# Altium integrated library Weidmueller_OMNIMATE_Signal.IntLib: 2550 symbols (part 42 of 45)
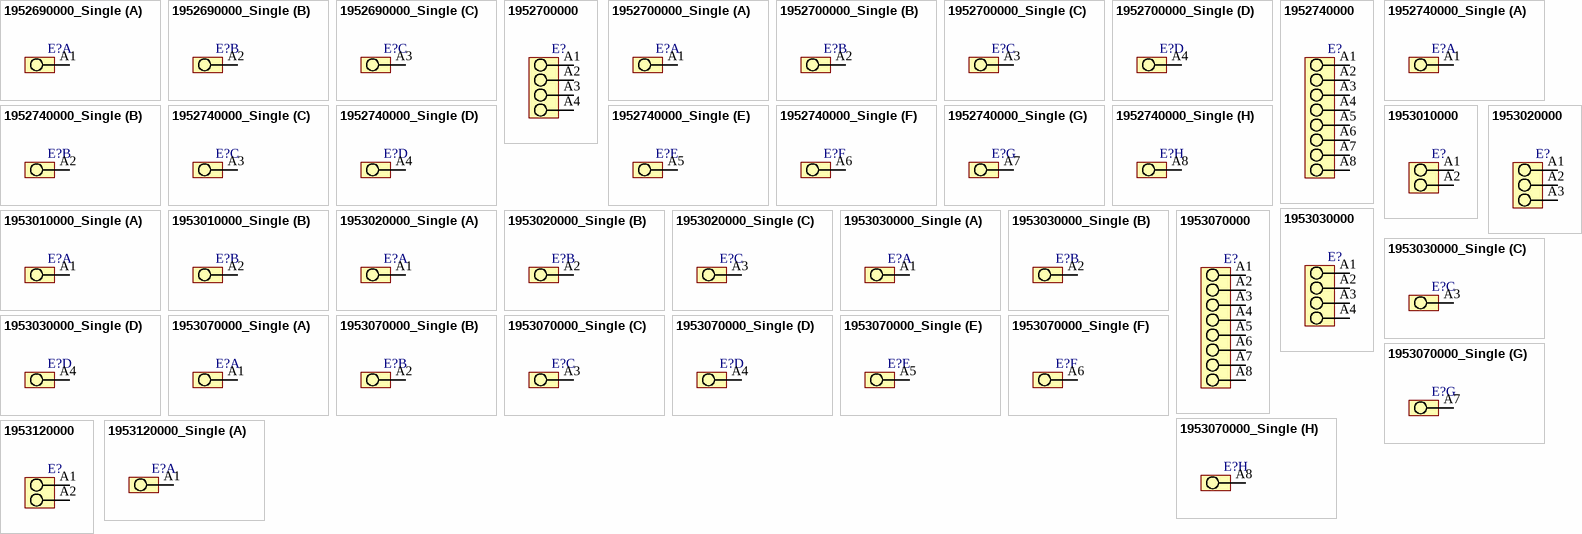
[diagram p252: symbols 1952690000_Single to 1953120000_Single]

## 1952740000_Single
designator E?
OMNIMATE Signal - series LMZF; PartNumber: 1952740000; Manufacturer: Weidmueller; Short_text_for_material: LMZFL 7/8/135 3.5SW; Side_termination_characteristic: closed side; Mounting_onto_the_PCB: Solder connection; Pitch_mm: 7,5 mm; Pitch_inch: 0,295 inch; No_of_poles: 8; Solder_pin_length_mm: 3,5 mm; Contact_material: E-Cu; Contact_surface: tinned; Insulating_material: Wemid (PA); UL_94_flammability_rating: V-0; Rated_voltage_for_surge_voltage_class_pollution_degree_II_2: 1000 V; Rated_current_min_no_of_poles_TU_20_deg_C: 24 A; Solid_min_H05_07_V_U: 0,13 mm²; Solid_max_H05_07_V_U: 2,5 mm²; Rated_voltage_use_group_B_UL_1059: 300 V; Rated_current_use_group_B_UL_1059: 15 A; Wire_cross_section_AWG_min_UL_1059: AWG 26; Wire_cross_section_AWG_max_UL_1059: AWG 14; PackageReference: LMZFL_7_135_08; Colour: Black; Packaging: Box; Qty: 100 PCS; Revision: V1; ComponentLink1Description: Manufacturer URL; ComponentLink1URL: http://www.weidmueller.com/; ComponentLink2Description: URL Link1; ComponentLink2URL: http://catalog.weidmueller.com/catalog/Start.do?localeId=en&ObjectID=1952740000
footprint LMZFL_7_135_08 (OMNIMATE Signal - Serie LMZF  LMZFL 7/8/135 3.5)
part A pins: A1
part B pins: A2
part C pins: A3
part D pins: A4
part E pins: A5
part F pins: A6
part G pins: A7
part H pins: A8
1 alternate drawing of the same symbol

## 1953010000
designator E?
OMNIMATE Signal - series LMZF; PartNumber: 1953010000; Manufacturer: Weidmueller; Short_text_for_material: LMZFL 7/2/135 3.5OR; Side_termination_characteristic: closed side; Mounting_onto_the_PCB: Solder connection; Pitch_mm: 7,5 mm; Pitch_inch: 0,295 inch; No_of_poles: 2; Solder_pin_length_mm: 3,5 mm; Contact_material: E-Cu; Contact_surface: tinned; Insulating_material: Wemid (PA); UL_94_flammability_rating: V-0; Rated_voltage_for_surge_voltage_class_pollution_degree_II_2: 1000 V; Solid_min_H05_07_V_U: 0,13 mm²; Solid_max_H05_07_V_U: 2,5 mm²; Rated_voltage_use_group_B_UL_1059: 300 V; Rated_current_use_group_B_UL_1059: 15 A; Wire_cross_section_AWG_min_UL_1059: AWG 26; Wire_cross_section_AWG_max_UL_1059: AWG 14; PackageReference: LMZFL_7_135_02; Colour: Orange; Packaging: Box; Qty: 100 PCS; Revision: V1; ComponentLink1Description: Manufacturer URL; ComponentLink1URL: http://www.weidmueller.com/; ComponentLink2Description: URL Link1; ComponentLink2URL: http://catalog.weidmueller.com/catalog/Start.do?localeId=en&ObjectID=1953010000
footprint LMZFL_7_135_02 (OMNIMATE Signal - Serie LMZF  LMZFL 7/2/135 3.5)
pins: A1, A2
1 alternate drawing of the same symbol

## 1953010000_Single
designator E?
OMNIMATE Signal - series LMZF; PartNumber: 1953010000; Manufacturer: Weidmueller; Short_text_for_material: LMZFL 7/2/135 3.5OR; Side_termination_characteristic: closed side; Mounting_onto_the_PCB: Solder connection; Pitch_mm: 7,5 mm; Pitch_inch: 0,295 inch; No_of_poles: 2; Solder_pin_length_mm: 3,5 mm; Contact_material: E-Cu; Contact_surface: tinned; Insulating_material: Wemid (PA); UL_94_flammability_rating: V-0; Rated_voltage_for_surge_voltage_class_pollution_degree_II_2: 1000 V; Solid_min_H05_07_V_U: 0,13 mm²; Solid_max_H05_07_V_U: 2,5 mm²; Rated_voltage_use_group_B_UL_1059: 300 V; Rated_current_use_group_B_UL_1059: 15 A; Wire_cross_section_AWG_min_UL_1059: AWG 26; Wire_cross_section_AWG_max_UL_1059: AWG 14; PackageReference: LMZFL_7_135_02; Colour: Orange; Packaging: Box; Qty: 100 PCS; Revision: V1; ComponentLink1Description: Manufacturer URL; ComponentLink1URL: http://www.weidmueller.com/; ComponentLink2Description: URL Link1; ComponentLink2URL: http://catalog.weidmueller.com/catalog/Start.do?localeId=en&ObjectID=1953010000
footprint LMZFL_7_135_02 (OMNIMATE Signal - Serie LMZF  LMZFL 7/2/135 3.5)
part A pins: A1
part B pins: A2
1 alternate drawing of the same symbol

## 1953020000
designator E?
OMNIMATE Signal - series LMZF; PartNumber: 1953020000; Manufacturer: Weidmueller; Short_text_for_material: LMZFL 7/3/135 3.5OR; Side_termination_characteristic: closed side; Mounting_onto_the_PCB: Solder connection; Pitch_mm: 7,5 mm; Pitch_inch: 0,295 inch; No_of_poles: 3; Solder_pin_length_mm: 3,5 mm; Contact_material: E-Cu; Contact_surface: tinned; Insulating_material: Wemid (PA); UL_94_flammability_rating: V-0; Rated_voltage_for_surge_voltage_class_pollution_degree_II_2: 1000 V; Solid_min_H05_07_V_U: 0,13 mm²; Solid_max_H05_07_V_U: 2,5 mm²; Rated_voltage_use_group_B_UL_1059: 300 V; Rated_current_use_group_B_UL_1059: 15 A; Wire_cross_section_AWG_min_UL_1059: AWG 26; Wire_cross_section_AWG_max_UL_1059: AWG 14; PackageReference: LMZFL_7_135_03; Colour: Orange; Packaging: Box; Qty: 100 PCS; Revision: V1; ComponentLink1Description: Manufacturer URL; ComponentLink1URL: http://www.weidmueller.com/; ComponentLink2Description: URL Link1; ComponentLink2URL: http://catalog.weidmueller.com/catalog/Start.do?localeId=en&ObjectID=1953020000
footprint LMZFL_7_135_03 (OMNIMATE Signal - Serie LMZF  LMZFL 7/3/135 3.5OR)
pins: A1, A2, A3
1 alternate drawing of the same symbol

## 1953020000_Single
designator E?
OMNIMATE Signal - series LMZF; PartNumber: 1953020000; Manufacturer: Weidmueller; Short_text_for_material: LMZFL 7/3/135 3.5OR; Side_termination_characteristic: closed side; Mounting_onto_the_PCB: Solder connection; Pitch_mm: 7,5 mm; Pitch_inch: 0,295 inch; No_of_poles: 3; Solder_pin_length_mm: 3,5 mm; Contact_material: E-Cu; Contact_surface: tinned; Insulating_material: Wemid (PA); UL_94_flammability_rating: V-0; Rated_voltage_for_surge_voltage_class_pollution_degree_II_2: 1000 V; Solid_min_H05_07_V_U: 0,13 mm²; Solid_max_H05_07_V_U: 2,5 mm²; Rated_voltage_use_group_B_UL_1059: 300 V; Rated_current_use_group_B_UL_1059: 15 A; Wire_cross_section_AWG_min_UL_1059: AWG 26; Wire_cross_section_AWG_max_UL_1059: AWG 14; PackageReference: LMZFL_7_135_03; Colour: Orange; Packaging: Box; Qty: 100 PCS; Revision: V1; ComponentLink1Description: Manufacturer URL; ComponentLink1URL: http://www.weidmueller.com/; ComponentLink2Description: URL Link1; ComponentLink2URL: http://catalog.weidmueller.com/catalog/Start.do?localeId=en&ObjectID=1953020000
footprint LMZFL_7_135_03 (OMNIMATE Signal - Serie LMZF  LMZFL 7/3/135 3.5OR)
part A pins: A1
part B pins: A2
part C pins: A3
1 alternate drawing of the same symbol

## 1953030000
designator E?
OMNIMATE Signal - series LMZF; PartNumber: 1953030000; Manufacturer: Weidmueller; Short_text_for_material: LMZFL 7/4/135 3.5OR; Side_termination_characteristic: closed side; Mounting_onto_the_PCB: Solder connection; Pitch_mm: 7,5 mm; Pitch_inch: 0,295 inch; No_of_poles: 4; Solder_pin_length_mm: 3,5 mm; Contact_material: E-Cu; Contact_surface: tinned; Insulating_material: Wemid (PA); UL_94_flammability_rating: V-0; Rated_voltage_for_surge_voltage_class_pollution_degree_II_2: 1000 V; Solid_min_H05_07_V_U: 0,13 mm²; Solid_max_H05_07_V_U: 2,5 mm²; Rated_voltage_use_group_B_UL_1059: 300 V; Rated_current_use_group_B_UL_1059: 15 A; Wire_cross_section_AWG_min_UL_1059: AWG 26; Wire_cross_section_AWG_max_UL_1059: AWG 14; PackageReference: LMZFL_7_135_04; Colour: Orange; Packaging: Box; Qty: 100 PCS; Revision: V1; ComponentLink1Description: Manufacturer URL; ComponentLink1URL: http://www.weidmueller.com/; ComponentLink2Description: URL Link1; ComponentLink2URL: http://catalog.weidmueller.com/catalog/Start.do?localeId=en&ObjectID=1953030000
footprint LMZFL_7_135_04 (OMNIMATE Signal - Serie LMZF  LMZFL 7/4/135 3.5OR)
pins: A1, A2, A3, A4
1 alternate drawing of the same symbol

## 1953030000_Single
designator E?
OMNIMATE Signal - series LMZF; PartNumber: 1953030000; Manufacturer: Weidmueller; Short_text_for_material: LMZFL 7/4/135 3.5OR; Side_termination_characteristic: closed side; Mounting_onto_the_PCB: Solder connection; Pitch_mm: 7,5 mm; Pitch_inch: 0,295 inch; No_of_poles: 4; Solder_pin_length_mm: 3,5 mm; Contact_material: E-Cu; Contact_surface: tinned; Insulating_material: Wemid (PA); UL_94_flammability_rating: V-0; Rated_voltage_for_surge_voltage_class_pollution_degree_II_2: 1000 V; Solid_min_H05_07_V_U: 0,13 mm²; Solid_max_H05_07_V_U: 2,5 mm²; Rated_voltage_use_group_B_UL_1059: 300 V; Rated_current_use_group_B_UL_1059: 15 A; Wire_cross_section_AWG_min_UL_1059: AWG 26; Wire_cross_section_AWG_max_UL_1059: AWG 14; PackageReference: LMZFL_7_135_04; Colour: Orange; Packaging: Box; Qty: 100 PCS; Revision: V1; ComponentLink1Description: Manufacturer URL; ComponentLink1URL: http://www.weidmueller.com/; ComponentLink2Description: URL Link1; ComponentLink2URL: http://catalog.weidmueller.com/catalog/Start.do?localeId=en&ObjectID=1953030000
footprint LMZFL_7_135_04 (OMNIMATE Signal - Serie LMZF  LMZFL 7/4/135 3.5OR)
part A pins: A1
part B pins: A2
part C pins: A3
part D pins: A4
1 alternate drawing of the same symbol

## 1953070000
designator E?
OMNIMATE Signal - series LMZF; PartNumber: 1953070000; Manufacturer: Weidmueller; Short_text_for_material: LMZFL 7/8/135 3.5OR; Side_termination_characteristic: closed side; Mounting_onto_the_PCB: Solder connection; Pitch_mm: 7,5 mm; Pitch_inch: 0,295 inch; No_of_poles: 8; Solder_pin_length_mm: 3,5 mm; Contact_material: E-Cu; Contact_surface: tinned; Insulating_material: Wemid (PA); UL_94_flammability_rating: V-0; Rated_voltage_for_surge_voltage_class_pollution_degree_II_2: 1000 V; Solid_min_H05_07_V_U: 0,13 mm²; Solid_max_H05_07_V_U: 2,5 mm²; Rated_voltage_use_group_B_UL_1059: 300 V; Rated_current_use_group_B_UL_1059: 15 A; Wire_cross_section_AWG_min_UL_1059: AWG 26; Wire_cross_section_AWG_max_UL_1059: AWG 14; PackageReference: LMZFL_7_135_08; Colour: Orange; Packaging: Box; Qty: 100 PCS; Revision: V1; ComponentLink1Description: Manufacturer URL; ComponentLink1URL: http://www.weidmueller.com/; ComponentLink2Description: URL Link1; ComponentLink2URL: http://catalog.weidmueller.com/catalog/Start.do?localeId=en&ObjectID=1953070000
footprint LMZFL_7_135_08 (OMNIMATE Signal - Serie LMZF  LMZFL 7/8/135 3.5)
pins: A1, A2, A3, A4, A5, A6, A7, A8
1 alternate drawing of the same symbol

## 1953070000_Single
designator E?
OMNIMATE Signal - series LMZF; PartNumber: 1953070000; Manufacturer: Weidmueller; Short_text_for_material: LMZFL 7/8/135 3.5OR; Side_termination_characteristic: closed side; Mounting_onto_the_PCB: Solder connection; Pitch_mm: 7,5 mm; Pitch_inch: 0,295 inch; No_of_poles: 8; Solder_pin_length_mm: 3,5 mm; Contact_material: E-Cu; Contact_surface: tinned; Insulating_material: Wemid (PA); UL_94_flammability_rating: V-0; Rated_voltage_for_surge_voltage_class_pollution_degree_II_2: 1000 V; Solid_min_H05_07_V_U: 0,13 mm²; Solid_max_H05_07_V_U: 2,5 mm²; Rated_voltage_use_group_B_UL_1059: 300 V; Rated_current_use_group_B_UL_1059: 15 A; Wire_cross_section_AWG_min_UL_1059: AWG 26; Wire_cross_section_AWG_max_UL_1059: AWG 14; PackageReference: LMZFL_7_135_08; Colour: Orange; Packaging: Box; Qty: 100 PCS; Revision: V1; ComponentLink1Description: Manufacturer URL; ComponentLink1URL: http://www.weidmueller.com/; ComponentLink2Description: URL Link1; ComponentLink2URL: http://catalog.weidmueller.com/catalog/Start.do?localeId=en&ObjectID=1953070000
footprint LMZFL_7_135_08 (OMNIMATE Signal - Serie LMZF  LMZFL 7/8/135 3.5)
part A pins: A1
part B pins: A2
part C pins: A3
part D pins: A4
part E pins: A5
part F pins: A6
part G pins: A7
part H pins: A8
1 alternate drawing of the same symbol

## 1953120000
designator E?
OMNIMATE Signal - series LMZF; PartNumber: 1953120000; Manufacturer: Weidmueller; Short_text_for_material: LMZF 10/2/135 3.5SW; Side_termination_characteristic: closed side; Mounting_onto_the_PCB: Solder connection; Pitch_mm: 10 mm; Pitch_inch: 0,394 inch; No_of_poles: 2; Solder_pin_length_mm: 3,5 mm; Contact_material: E-Cu; Contact_surface: tinned; Insulating_material: Wemid (PA); UL_94_flammability_rating: V-0; Rated_voltage_for_surge_voltage_class_pollution_degree_II_2: 1000 V; Rated_current_min_no_of_poles_TU_20_deg_C: 24 A; Solid_min_H05_07_V_U: 0,13 mm²; Solid_max_H05_07_V_U: 2,5 mm²; Rated_voltage_use_group_B_UL_1059: 300 V; Rated_current_use_group_B_UL_1059: 15 A; Wire_cross_section_AWG_min_UL_1059: AWG 26; Wire_cross_section_AWG_max_UL_1059: AWG 14; PackageReference: LMZF_10_135_02; Colour: Black; Packaging: Box; Qty: 100 PCS; Revision: V1; ComponentLink1Description: Manufacturer URL; ComponentLink1URL: http://www.weidmueller.com/; ComponentLink2Description: URL Link1; ComponentLink2URL: http://catalog.weidmueller.com/catalog/Start.do?localeId=en&ObjectID=1953120000
footprint LMZF_10_135_02 (OMNIMATE Signal - Serie LMZF  LMZF 10/2/135 3.5)
pins: A1, A2
1 alternate drawing of the same symbol

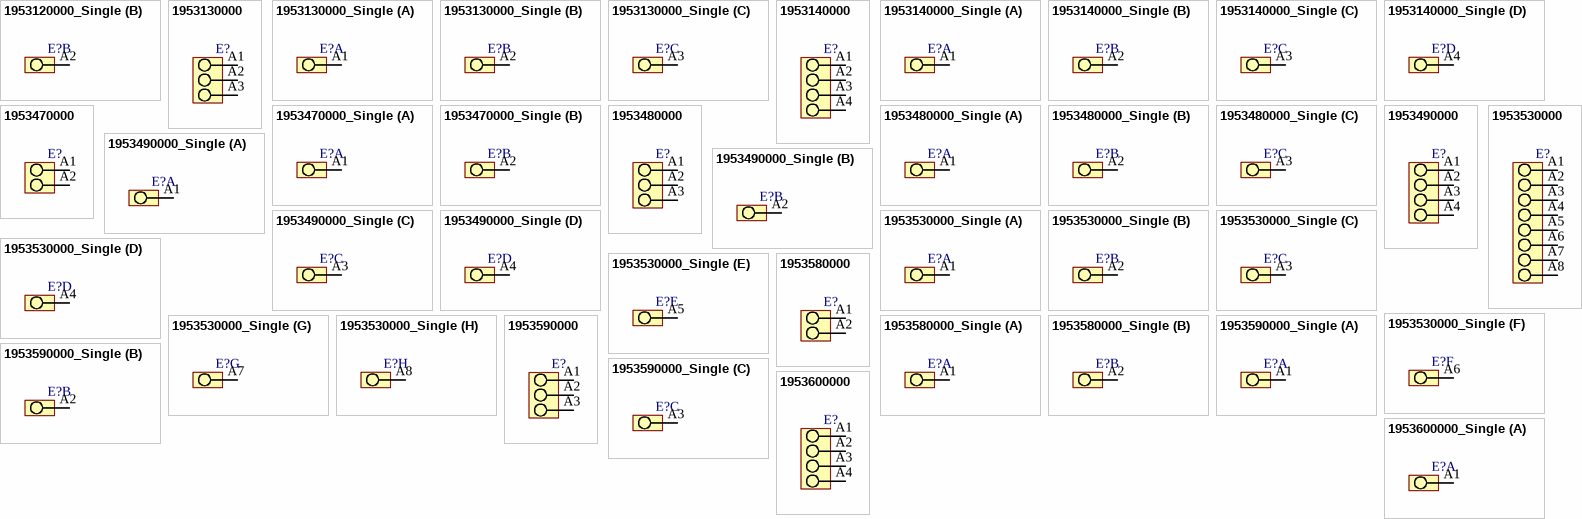
[diagram p192: symbols 1953120000_Single to 1953600000_Single]

## 1953120000_Single
designator E?
OMNIMATE Signal - series LMZF; PartNumber: 1953120000; Manufacturer: Weidmueller; Short_text_for_material: LMZF 10/2/135 3.5SW; Side_termination_characteristic: closed side; Mounting_onto_the_PCB: Solder connection; Pitch_mm: 10 mm; Pitch_inch: 0,394 inch; No_of_poles: 2; Solder_pin_length_mm: 3,5 mm; Contact_material: E-Cu; Contact_surface: tinned; Insulating_material: Wemid (PA); UL_94_flammability_rating: V-0; Rated_voltage_for_surge_voltage_class_pollution_degree_II_2: 1000 V; Rated_current_min_no_of_poles_TU_20_deg_C: 24 A; Solid_min_H05_07_V_U: 0,13 mm²; Solid_max_H05_07_V_U: 2,5 mm²; Rated_voltage_use_group_B_UL_1059: 300 V; Rated_current_use_group_B_UL_1059: 15 A; Wire_cross_section_AWG_min_UL_1059: AWG 26; Wire_cross_section_AWG_max_UL_1059: AWG 14; PackageReference: LMZF_10_135_02; Colour: Black; Packaging: Box; Qty: 100 PCS; Revision: V1; ComponentLink1Description: Manufacturer URL; ComponentLink1URL: http://www.weidmueller.com/; ComponentLink2Description: URL Link1; ComponentLink2URL: http://catalog.weidmueller.com/catalog/Start.do?localeId=en&ObjectID=1953120000
footprint LMZF_10_135_02 (OMNIMATE Signal - Serie LMZF  LMZF 10/2/135 3.5)
part A pins: A1
part B pins: A2
1 alternate drawing of the same symbol

## 1953130000
designator E?
OMNIMATE Signal - series LMZF; PartNumber: 1953130000; Manufacturer: Weidmueller; Short_text_for_material: LMZF 10/3/135 3.5SW; Side_termination_characteristic: closed side; Mounting_onto_the_PCB: Solder connection; Pitch_mm: 10 mm; Pitch_inch: 0,394 inch; No_of_poles: 3; Solder_pin_length_mm: 3,5 mm; Contact_material: E-Cu; Contact_surface: tinned; Insulating_material: Wemid (PA); UL_94_flammability_rating: V-0; Rated_voltage_for_surge_voltage_class_pollution_degree_II_2: 1000 V; Rated_current_min_no_of_poles_TU_20_deg_C: 24 A; Solid_min_H05_07_V_U: 0,13 mm²; Solid_max_H05_07_V_U: 2,5 mm²; Rated_voltage_use_group_B_UL_1059: 300 V; Rated_current_use_group_B_UL_1059: 15 A; Wire_cross_section_AWG_min_UL_1059: AWG 26; Wire_cross_section_AWG_max_UL_1059: AWG 14; PackageReference: LMZF_10_135_03; Colour: Black; Packaging: Box; Qty: 100 PCS; Revision: V1; ComponentLink1Description: Manufacturer URL; ComponentLink1URL: http://www.weidmueller.com/; ComponentLink2Description: URL Link1; ComponentLink2URL: http://catalog.weidmueller.com/catalog/Start.do?localeId=en&ObjectID=1953130000
footprint LMZF_10_135_03 (OMNIMATE Signal - Serie LMZF  LMZF 10/3/135 3.5)
pins: A1, A2, A3
1 alternate drawing of the same symbol

## 1953130000_Single
designator E?
OMNIMATE Signal - series LMZF; PartNumber: 1953130000; Manufacturer: Weidmueller; Short_text_for_material: LMZF 10/3/135 3.5SW; Side_termination_characteristic: closed side; Mounting_onto_the_PCB: Solder connection; Pitch_mm: 10 mm; Pitch_inch: 0,394 inch; No_of_poles: 3; Solder_pin_length_mm: 3,5 mm; Contact_material: E-Cu; Contact_surface: tinned; Insulating_material: Wemid (PA); UL_94_flammability_rating: V-0; Rated_voltage_for_surge_voltage_class_pollution_degree_II_2: 1000 V; Rated_current_min_no_of_poles_TU_20_deg_C: 24 A; Solid_min_H05_07_V_U: 0,13 mm²; Solid_max_H05_07_V_U: 2,5 mm²; Rated_voltage_use_group_B_UL_1059: 300 V; Rated_current_use_group_B_UL_1059: 15 A; Wire_cross_section_AWG_min_UL_1059: AWG 26; Wire_cross_section_AWG_max_UL_1059: AWG 14; PackageReference: LMZF_10_135_03; Colour: Black; Packaging: Box; Qty: 100 PCS; Revision: V1; ComponentLink1Description: Manufacturer URL; ComponentLink1URL: http://www.weidmueller.com/; ComponentLink2Description: URL Link1; ComponentLink2URL: http://catalog.weidmueller.com/catalog/Start.do?localeId=en&ObjectID=1953130000
footprint LMZF_10_135_03 (OMNIMATE Signal - Serie LMZF  LMZF 10/3/135 3.5)
part A pins: A1
part B pins: A2
part C pins: A3
1 alternate drawing of the same symbol

## 1953140000
designator E?
OMNIMATE Signal - series LMZF; PartNumber: 1953140000; Manufacturer: Weidmueller; Short_text_for_material: LMZF 10/4/135 3.5SW; Side_termination_characteristic: closed side; Mounting_onto_the_PCB: Solder connection; Pitch_mm: 10 mm; Pitch_inch: 0,394 inch; No_of_poles: 4; Solder_pin_length_mm: 3,5 mm; Contact_material: E-Cu; Contact_surface: tinned; Insulating_material: Wemid (PA); UL_94_flammability_rating: V-0; Rated_voltage_for_surge_voltage_class_pollution_degree_II_2: 1000 V; Rated_current_min_no_of_poles_TU_20_deg_C: 24 A; Solid_min_H05_07_V_U: 0,13 mm²; Solid_max_H05_07_V_U: 2,5 mm²; Rated_voltage_use_group_B_UL_1059: 300 V; Rated_current_use_group_B_UL_1059: 15 A; Wire_cross_section_AWG_min_UL_1059: AWG 26; Wire_cross_section_AWG_max_UL_1059: AWG 14; PackageReference: LMZF_10_135_04; Colour: Black; Packaging: Box; Qty: 100 PCS; Revision: V1; ComponentLink1Description: Manufacturer URL; ComponentLink1URL: http://www.weidmueller.com/; ComponentLink2Description: URL Link1; ComponentLink2URL: http://catalog.weidmueller.com/catalog/Start.do?localeId=en&ObjectID=1953140000
footprint LMZF_10_135_04 (OMNIMATE Signal - Serie LMZF  LMZF 10/4/135 3.5)
pins: A1, A2, A3, A4
1 alternate drawing of the same symbol

## 1953140000_Single
designator E?
OMNIMATE Signal - series LMZF; PartNumber: 1953140000; Manufacturer: Weidmueller; Short_text_for_material: LMZF 10/4/135 3.5SW; Side_termination_characteristic: closed side; Mounting_onto_the_PCB: Solder connection; Pitch_mm: 10 mm; Pitch_inch: 0,394 inch; No_of_poles: 4; Solder_pin_length_mm: 3,5 mm; Contact_material: E-Cu; Contact_surface: tinned; Insulating_material: Wemid (PA); UL_94_flammability_rating: V-0; Rated_voltage_for_surge_voltage_class_pollution_degree_II_2: 1000 V; Rated_current_min_no_of_poles_TU_20_deg_C: 24 A; Solid_min_H05_07_V_U: 0,13 mm²; Solid_max_H05_07_V_U: 2,5 mm²; Rated_voltage_use_group_B_UL_1059: 300 V; Rated_current_use_group_B_UL_1059: 15 A; Wire_cross_section_AWG_min_UL_1059: AWG 26; Wire_cross_section_AWG_max_UL_1059: AWG 14; PackageReference: LMZF_10_135_04; Colour: Black; Packaging: Box; Qty: 100 PCS; Revision: V1; ComponentLink1Description: Manufacturer URL; ComponentLink1URL: http://www.weidmueller.com/; ComponentLink2Description: URL Link1; ComponentLink2URL: http://catalog.weidmueller.com/catalog/Start.do?localeId=en&ObjectID=1953140000
footprint LMZF_10_135_04 (OMNIMATE Signal - Serie LMZF  LMZF 10/4/135 3.5)
part A pins: A1
part B pins: A2
part C pins: A3
part D pins: A4
1 alternate drawing of the same symbol

## 1953470000
designator E?
OMNIMATE Signal - series LMZF; PartNumber: 1953470000; Manufacturer: Weidmueller; Short_text_for_material: LMZF 10/2/135 3.5OR; Side_termination_characteristic: closed side; Mounting_onto_the_PCB: Solder connection; Pitch_mm: 10 mm; Pitch_inch: 0,394 inch; No_of_poles: 2; Solder_pin_length_mm: 3,5 mm; Contact_material: E-Cu; Contact_surface: tinned; Insulating_material: Wemid (PA); UL_94_flammability_rating: V-0; Rated_voltage_for_surge_voltage_class_pollution_degree_II_2: 1000 V; Solid_min_H05_07_V_U: 0,13 mm²; Solid_max_H05_07_V_U: 2,5 mm²; Rated_voltage_use_group_B_UL_1059: 300 V; Rated_current_use_group_B_UL_1059: 15 A; Wire_cross_section_AWG_min_UL_1059: AWG 26; Wire_cross_section_AWG_max_UL_1059: AWG 14; PackageReference: LMZF_10_135_02; Colour: Orange; Packaging: Box; Qty: 100 PCS; Revision: V1; ComponentLink1Description: Manufacturer URL; ComponentLink1URL: http://www.weidmueller.com/; ComponentLink2Description: URL Link1; ComponentLink2URL: http://catalog.weidmueller.com/catalog/Start.do?localeId=en&ObjectID=1953470000
footprint LMZF_10_135_02 (OMNIMATE Signal - Serie LMZF  LMZF 10/2/135 3.5)
pins: A1, A2
1 alternate drawing of the same symbol

## 1953470000_Single
designator E?
OMNIMATE Signal - series LMZF; PartNumber: 1953470000; Manufacturer: Weidmueller; Short_text_for_material: LMZF 10/2/135 3.5OR; Side_termination_characteristic: closed side; Mounting_onto_the_PCB: Solder connection; Pitch_mm: 10 mm; Pitch_inch: 0,394 inch; No_of_poles: 2; Solder_pin_length_mm: 3,5 mm; Contact_material: E-Cu; Contact_surface: tinned; Insulating_material: Wemid (PA); UL_94_flammability_rating: V-0; Rated_voltage_for_surge_voltage_class_pollution_degree_II_2: 1000 V; Solid_min_H05_07_V_U: 0,13 mm²; Solid_max_H05_07_V_U: 2,5 mm²; Rated_voltage_use_group_B_UL_1059: 300 V; Rated_current_use_group_B_UL_1059: 15 A; Wire_cross_section_AWG_min_UL_1059: AWG 26; Wire_cross_section_AWG_max_UL_1059: AWG 14; PackageReference: LMZF_10_135_02; Colour: Orange; Packaging: Box; Qty: 100 PCS; Revision: V1; ComponentLink1Description: Manufacturer URL; ComponentLink1URL: http://www.weidmueller.com/; ComponentLink2Description: URL Link1; ComponentLink2URL: http://catalog.weidmueller.com/catalog/Start.do?localeId=en&ObjectID=1953470000
footprint LMZF_10_135_02 (OMNIMATE Signal - Serie LMZF  LMZF 10/2/135 3.5)
part A pins: A1
part B pins: A2
1 alternate drawing of the same symbol

## 1953480000
designator E?
OMNIMATE Signal - series LMZF; PartNumber: 1953480000; Manufacturer: Weidmueller; Short_text_for_material: LMZF 10/3/135 3.5OR; Side_termination_characteristic: closed side; Mounting_onto_the_PCB: Solder connection; Pitch_mm: 10 mm; Pitch_inch: 0,394 inch; No_of_poles: 3; Solder_pin_length_mm: 3,5 mm; Contact_material: E-Cu; Contact_surface: tinned; Insulating_material: Wemid (PA); UL_94_flammability_rating: V-0; Rated_voltage_for_surge_voltage_class_pollution_degree_II_2: 1000 V; Solid_min_H05_07_V_U: 0,13 mm²; Solid_max_H05_07_V_U: 2,5 mm²; Rated_voltage_use_group_B_UL_1059: 300 V; Rated_current_use_group_B_UL_1059: 15 A; Wire_cross_section_AWG_min_UL_1059: AWG 26; Wire_cross_section_AWG_max_UL_1059: AWG 14; PackageReference: LMZF_10_135_03; Colour: Orange; Packaging: Box; Qty: 100 PCS; Revision: V1; ComponentLink1Description: Manufacturer URL; ComponentLink1URL: http://www.weidmueller.com/; ComponentLink2Description: URL Link1; ComponentLink2URL: http://catalog.weidmueller.com/catalog/Start.do?localeId=en&ObjectID=1953480000
footprint LMZF_10_135_03 (OMNIMATE Signal - Serie LMZF  LMZF 10/3/135 3.5)
pins: A1, A2, A3
1 alternate drawing of the same symbol

## 1953480000_Single
designator E?
OMNIMATE Signal - series LMZF; PartNumber: 1953480000; Manufacturer: Weidmueller; Short_text_for_material: LMZF 10/3/135 3.5OR; Side_termination_characteristic: closed side; Mounting_onto_the_PCB: Solder connection; Pitch_mm: 10 mm; Pitch_inch: 0,394 inch; No_of_poles: 3; Solder_pin_length_mm: 3,5 mm; Contact_material: E-Cu; Contact_surface: tinned; Insulating_material: Wemid (PA); UL_94_flammability_rating: V-0; Rated_voltage_for_surge_voltage_class_pollution_degree_II_2: 1000 V; Solid_min_H05_07_V_U: 0,13 mm²; Solid_max_H05_07_V_U: 2,5 mm²; Rated_voltage_use_group_B_UL_1059: 300 V; Rated_current_use_group_B_UL_1059: 15 A; Wire_cross_section_AWG_min_UL_1059: AWG 26; Wire_cross_section_AWG_max_UL_1059: AWG 14; PackageReference: LMZF_10_135_03; Colour: Orange; Packaging: Box; Qty: 100 PCS; Revision: V1; ComponentLink1Description: Manufacturer URL; ComponentLink1URL: http://www.weidmueller.com/; ComponentLink2Description: URL Link1; ComponentLink2URL: http://catalog.weidmueller.com/catalog/Start.do?localeId=en&ObjectID=1953480000
footprint LMZF_10_135_03 (OMNIMATE Signal - Serie LMZF  LMZF 10/3/135 3.5)
part A pins: A1
part B pins: A2
part C pins: A3
1 alternate drawing of the same symbol

## 1953490000
designator E?
OMNIMATE Signal - series LMZF; PartNumber: 1953490000; Manufacturer: Weidmueller; Short_text_for_material: LMZF 10/4/135 3.5OR; Side_termination_characteristic: closed side; Mounting_onto_the_PCB: Solder connection; Pitch_mm: 10 mm; Pitch_inch: 0,394 inch; No_of_poles: 4; Solder_pin_length_mm: 3,5 mm; Contact_material: E-Cu; Contact_surface: tinned; Insulating_material: Wemid (PA); UL_94_flammability_rating: V-0; Rated_voltage_for_surge_voltage_class_pollution_degree_II_2: 1000 V; Solid_min_H05_07_V_U: 0,13 mm²; Solid_max_H05_07_V_U: 2,5 mm²; Rated_voltage_use_group_B_UL_1059: 300 V; Rated_current_use_group_B_UL_1059: 15 A; Wire_cross_section_AWG_min_UL_1059: AWG 26; Wire_cross_section_AWG_max_UL_1059: AWG 14; PackageReference: LMZF_10_135_04; Colour: Orange; Packaging: Box; Qty: 100 PCS; Revision: V1; ComponentLink1Description: Manufacturer URL; ComponentLink1URL: http://www.weidmueller.com/; ComponentLink2Description: URL Link1; ComponentLink2URL: http://catalog.weidmueller.com/catalog/Start.do?localeId=en&ObjectID=1953490000
footprint LMZF_10_135_04 (OMNIMATE Signal - Serie LMZF  LMZF 10/4/135 3.5)
pins: A1, A2, A3, A4
1 alternate drawing of the same symbol

## 1953490000_Single
designator E?
OMNIMATE Signal - series LMZF; PartNumber: 1953490000; Manufacturer: Weidmueller; Short_text_for_material: LMZF 10/4/135 3.5OR; Side_termination_characteristic: closed side; Mounting_onto_the_PCB: Solder connection; Pitch_mm: 10 mm; Pitch_inch: 0,394 inch; No_of_poles: 4; Solder_pin_length_mm: 3,5 mm; Contact_material: E-Cu; Contact_surface: tinned; Insulating_material: Wemid (PA); UL_94_flammability_rating: V-0; Rated_voltage_for_surge_voltage_class_pollution_degree_II_2: 1000 V; Solid_min_H05_07_V_U: 0,13 mm²; Solid_max_H05_07_V_U: 2,5 mm²; Rated_voltage_use_group_B_UL_1059: 300 V; Rated_current_use_group_B_UL_1059: 15 A; Wire_cross_section_AWG_min_UL_1059: AWG 26; Wire_cross_section_AWG_max_UL_1059: AWG 14; PackageReference: LMZF_10_135_04; Colour: Orange; Packaging: Box; Qty: 100 PCS; Revision: V1; ComponentLink1Description: Manufacturer URL; ComponentLink1URL: http://www.weidmueller.com/; ComponentLink2Description: URL Link1; ComponentLink2URL: http://catalog.weidmueller.com/catalog/Start.do?localeId=en&ObjectID=1953490000
footprint LMZF_10_135_04 (OMNIMATE Signal - Serie LMZF  LMZF 10/4/135 3.5)
part A pins: A1
part B pins: A2
part C pins: A3
part D pins: A4
1 alternate drawing of the same symbol

## 1953530000
designator E?
OMNIMATE Signal - series LMZF; PartNumber: 1953530000; Manufacturer: Weidmueller; Short_text_for_material: LMZF 10/8/135 3.5OR; Side_termination_characteristic: closed side; Mounting_onto_the_PCB: Solder connection; Pitch_mm: 10 mm; Pitch_inch: 0,394 inch; No_of_poles: 8; Solder_pin_length_mm: 3,5 mm; Contact_material: E-Cu; Contact_surface: tinned; Insulating_material: Wemid (PA); UL_94_flammability_rating: V-0; Rated_voltage_for_surge_voltage_class_pollution_degree_II_2: 1000 V; Solid_min_H05_07_V_U: 0,13 mm²; Solid_max_H05_07_V_U: 2,5 mm²; Rated_voltage_use_group_B_UL_1059: 300 V; Rated_current_use_group_B_UL_1059: 15 A; Wire_cross_section_AWG_min_UL_1059: AWG 26; Wire_cross_section_AWG_max_UL_1059: AWG 14; PackageReference: LMZF_10_135_08; Colour: Orange; Packaging: Box; Qty: 100 PCS; Revision: V1; ComponentLink1Description: Manufacturer URL; ComponentLink1URL: http://www.weidmueller.com/; ComponentLink2Description: URL Link1; ComponentLink2URL: http://catalog.weidmueller.com/catalog/Start.do?localeId=en&ObjectID=1953530000
footprint LMZF_10_135_08 (OMNIMATE Signal - Serie LMZF  LMZF 10/8/135 3.5)
pins: A1, A2, A3, A4, A5, A6, A7, A8
1 alternate drawing of the same symbol

## 1953530000_Single
designator E?
OMNIMATE Signal - series LMZF; PartNumber: 1953530000; Manufacturer: Weidmueller; Short_text_for_material: LMZF 10/8/135 3.5OR; Side_termination_characteristic: closed side; Mounting_onto_the_PCB: Solder connection; Pitch_mm: 10 mm; Pitch_inch: 0,394 inch; No_of_poles: 8; Solder_pin_length_mm: 3,5 mm; Contact_material: E-Cu; Contact_surface: tinned; Insulating_material: Wemid (PA); UL_94_flammability_rating: V-0; Rated_voltage_for_surge_voltage_class_pollution_degree_II_2: 1000 V; Solid_min_H05_07_V_U: 0,13 mm²; Solid_max_H05_07_V_U: 2,5 mm²; Rated_voltage_use_group_B_UL_1059: 300 V; Rated_current_use_group_B_UL_1059: 15 A; Wire_cross_section_AWG_min_UL_1059: AWG 26; Wire_cross_section_AWG_max_UL_1059: AWG 14; PackageReference: LMZF_10_135_08; Colour: Orange; Packaging: Box; Qty: 100 PCS; Revision: V1; ComponentLink1Description: Manufacturer URL; ComponentLink1URL: http://www.weidmueller.com/; ComponentLink2Description: URL Link1; ComponentLink2URL: http://catalog.weidmueller.com/catalog/Start.do?localeId=en&ObjectID=1953530000
footprint LMZF_10_135_08 (OMNIMATE Signal - Serie LMZF  LMZF 10/8/135 3.5)
part A pins: A1
part B pins: A2
part C pins: A3
part D pins: A4
part E pins: A5
part F pins: A6
part G pins: A7
part H pins: A8
1 alternate drawing of the same symbol

## 1953580000
designator E?
OMNIMATE Signal - series LMZF; PartNumber: 1953580000; Manufacturer: Weidmueller; Short_text_for_material: LMZFL 10/2/135 3.5SW; Side_termination_characteristic: closed side; Mounting_onto_the_PCB: Solder connection; Pitch_mm: 10 mm; Pitch_inch: 0,394 inch; No_of_poles: 2; Solder_pin_length_mm: 3,5 mm; Contact_material: E-Cu; Contact_surface: tinned; Insulating_material: Wemid (PA); UL_94_flammability_rating: V-0; Rated_voltage_for_surge_voltage_class_pollution_degree_II_2: 1000 V; Rated_current_min_no_of_poles_TU_20_deg_C: 24 A; Solid_min_H05_07_V_U: 0,13 mm²; Solid_max_H05_07_V_U: 2,5 mm²; Rated_voltage_use_group_B_UL_1059: 300 V; Rated_current_use_group_B_UL_1059: 15 A; Wire_cross_section_AWG_min_UL_1059: AWG 26; Wire_cross_section_AWG_max_UL_1059: AWG 14; PackageReference: LMZFL_10_135_02; Colour: Black; Packaging: Box; Qty: 100 PCS; Revision: V1; ComponentLink1Description: Manufacturer URL; ComponentLink1URL: http://www.weidmueller.com/; ComponentLink2Description: URL Link1; ComponentLink2URL: http://catalog.weidmueller.com/catalog/Start.do?localeId=en&ObjectID=1953580000
footprint LMZFL_10_135_02 (OMNIMATE Signal - Serie LMZF  LMZFL 10/2/135 3.5)
pins: A1, A2
1 alternate drawing of the same symbol

## 1953580000_Single
designator E?
OMNIMATE Signal - series LMZF; PartNumber: 1953580000; Manufacturer: Weidmueller; Short_text_for_material: LMZFL 10/2/135 3.5SW; Side_termination_characteristic: closed side; Mounting_onto_the_PCB: Solder connection; Pitch_mm: 10 mm; Pitch_inch: 0,394 inch; No_of_poles: 2; Solder_pin_length_mm: 3,5 mm; Contact_material: E-Cu; Contact_surface: tinned; Insulating_material: Wemid (PA); UL_94_flammability_rating: V-0; Rated_voltage_for_surge_voltage_class_pollution_degree_II_2: 1000 V; Rated_current_min_no_of_poles_TU_20_deg_C: 24 A; Solid_min_H05_07_V_U: 0,13 mm²; Solid_max_H05_07_V_U: 2,5 mm²; Rated_voltage_use_group_B_UL_1059: 300 V; Rated_current_use_group_B_UL_1059: 15 A; Wire_cross_section_AWG_min_UL_1059: AWG 26; Wire_cross_section_AWG_max_UL_1059: AWG 14; PackageReference: LMZFL_10_135_02; Colour: Black; Packaging: Box; Qty: 100 PCS; Revision: V1; ComponentLink1Description: Manufacturer URL; ComponentLink1URL: http://www.weidmueller.com/; ComponentLink2Description: URL Link1; ComponentLink2URL: http://catalog.weidmueller.com/catalog/Start.do?localeId=en&ObjectID=1953580000
footprint LMZFL_10_135_02 (OMNIMATE Signal - Serie LMZF  LMZFL 10/2/135 3.5)
part A pins: A1
part B pins: A2
1 alternate drawing of the same symbol

## 1953590000
designator E?
OMNIMATE Signal - series LMZF; PartNumber: 1953590000; Manufacturer: Weidmueller; Short_text_for_material: LMZFL 10/3/135 3.5SW; Side_termination_characteristic: closed side; Mounting_onto_the_PCB: Solder connection; Pitch_mm: 10 mm; Pitch_inch: 0,394 inch; No_of_poles: 3; Solder_pin_length_mm: 3,5 mm; Contact_material: E-Cu; Contact_surface: tinned; Insulating_material: Wemid (PA); UL_94_flammability_rating: V-0; Rated_voltage_for_surge_voltage_class_pollution_degree_II_2: 1000 V; Rated_current_min_no_of_poles_TU_20_deg_C: 24 A; Solid_min_H05_07_V_U: 0,13 mm²; Solid_max_H05_07_V_U: 2,5 mm²; Rated_voltage_use_group_B_UL_1059: 300 V; Rated_current_use_group_B_UL_1059: 15 A; Wire_cross_section_AWG_min_UL_1059: AWG 26; Wire_cross_section_AWG_max_UL_1059: AWG 14; PackageReference: LMZFL_10_135_03; Colour: Black; Packaging: Box; Qty: 100 PCS; Revision: V1; ComponentLink1Description: Manufacturer URL; ComponentLink1URL: http://www.weidmueller.com/; ComponentLink2Description: URL Link1; ComponentLink2URL: http://catalog.weidmueller.com/catalog/Start.do?localeId=en&ObjectID=1953590000
footprint LMZFL_10_135_03 (OMNIMATE Signal - Serie LMZF  LMZFL 10/3/135 3.5)
pins: A1, A2, A3
1 alternate drawing of the same symbol

## 1953590000_Single
designator E?
OMNIMATE Signal - series LMZF; PartNumber: 1953590000; Manufacturer: Weidmueller; Short_text_for_material: LMZFL 10/3/135 3.5SW; Side_termination_characteristic: closed side; Mounting_onto_the_PCB: Solder connection; Pitch_mm: 10 mm; Pitch_inch: 0,394 inch; No_of_poles: 3; Solder_pin_length_mm: 3,5 mm; Contact_material: E-Cu; Contact_surface: tinned; Insulating_material: Wemid (PA); UL_94_flammability_rating: V-0; Rated_voltage_for_surge_voltage_class_pollution_degree_II_2: 1000 V; Rated_current_min_no_of_poles_TU_20_deg_C: 24 A; Solid_min_H05_07_V_U: 0,13 mm²; Solid_max_H05_07_V_U: 2,5 mm²; Rated_voltage_use_group_B_UL_1059: 300 V; Rated_current_use_group_B_UL_1059: 15 A; Wire_cross_section_AWG_min_UL_1059: AWG 26; Wire_cross_section_AWG_max_UL_1059: AWG 14; PackageReference: LMZFL_10_135_03; Colour: Black; Packaging: Box; Qty: 100 PCS; Revision: V1; ComponentLink1Description: Manufacturer URL; ComponentLink1URL: http://www.weidmueller.com/; ComponentLink2Description: URL Link1; ComponentLink2URL: http://catalog.weidmueller.com/catalog/Start.do?localeId=en&ObjectID=1953590000
footprint LMZFL_10_135_03 (OMNIMATE Signal - Serie LMZF  LMZFL 10/3/135 3.5)
part A pins: A1
part B pins: A2
part C pins: A3
1 alternate drawing of the same symbol

## 1953600000
designator E?